# Altium footprint library Connectors.PcbLib: 164 footprints (part 7 of 11)
Each footprint in its own frame and in the unit in brackets; x right, y up, seen from the top. Pads: shape width x height; smd on the part's side, far side on the other; paste and mask are expansions set on the pad; w line width, h text height; cw(c..) or ccw(c..) is an arc to the next point about the centre after c.
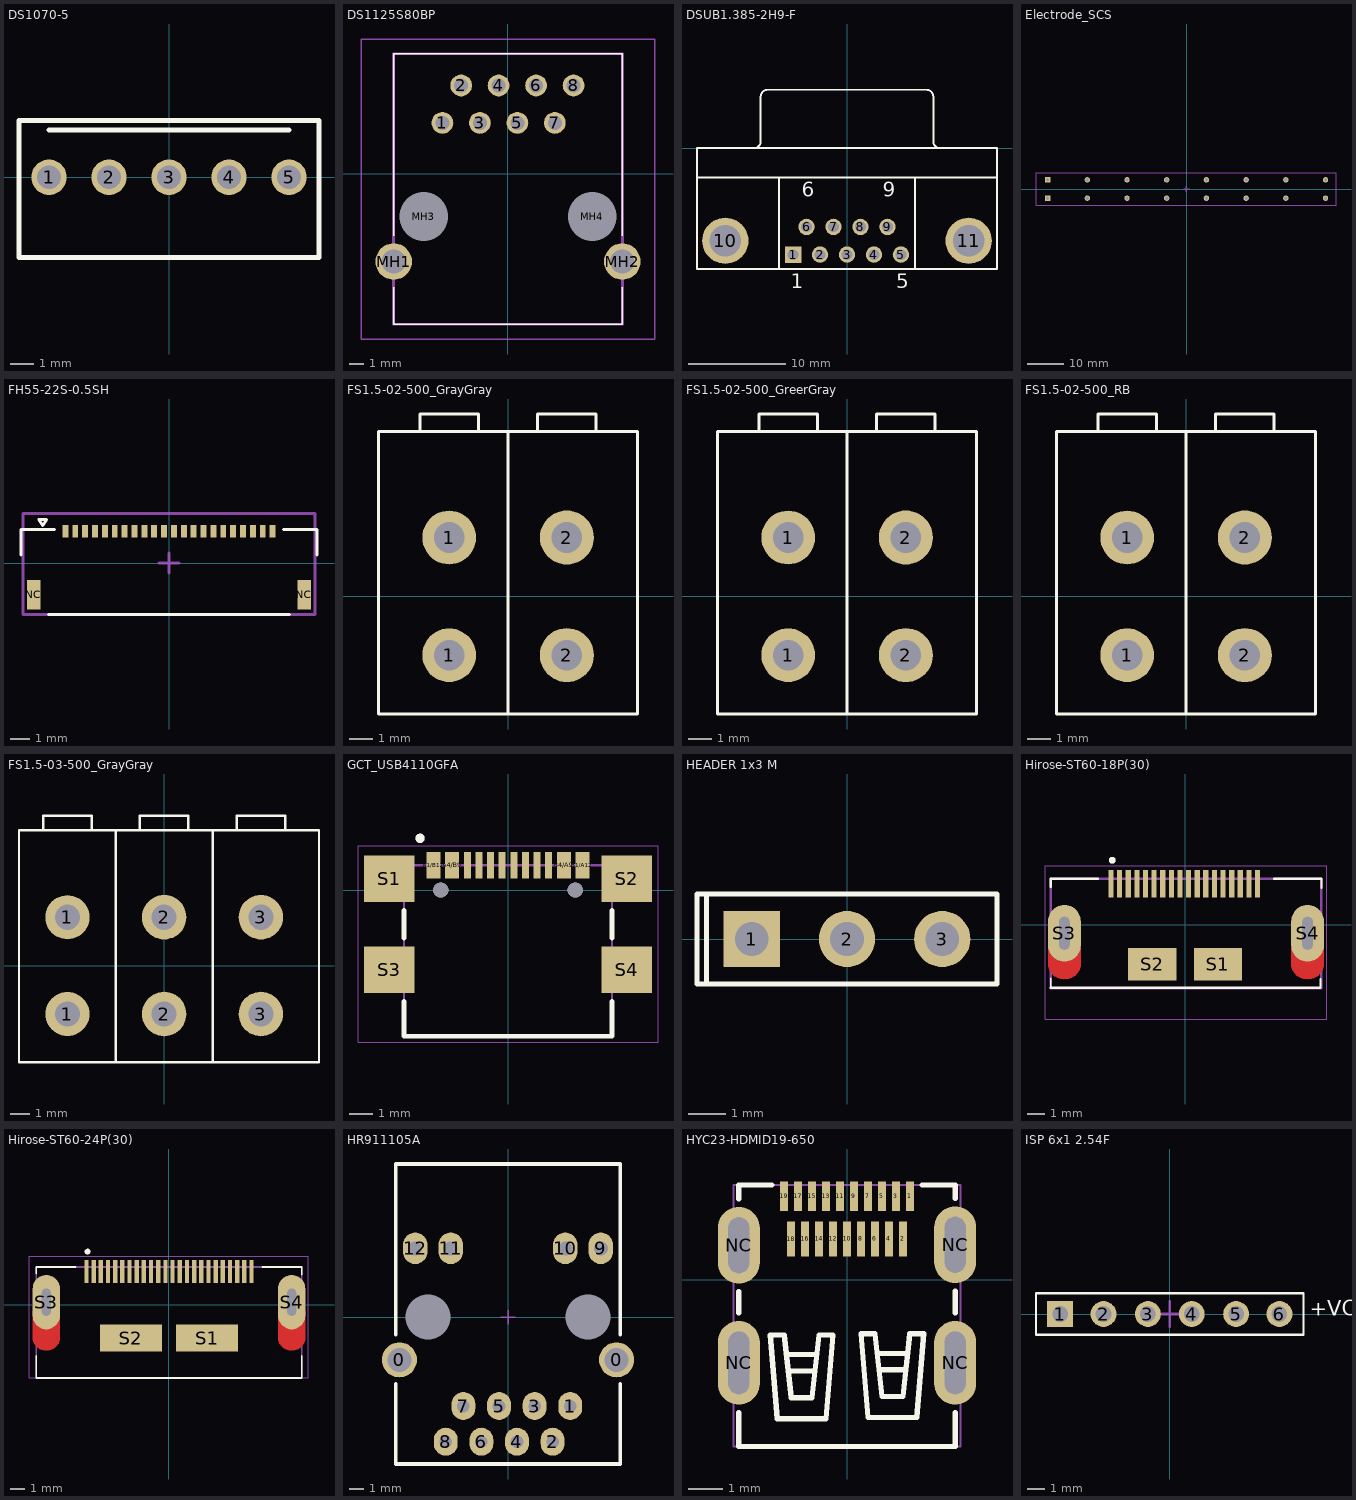
[diagram p6: the footprints below, top view; thin cyan lines are the x and y axes]

## DS1070-5 [mm]
height 11.5
pads (5):
  round 1.5 hole 1: 1(-5.08,0) 2(-2.54,0) 3(0,0) 4(2.54,0) 5(5.08,0)
Top Overlay:
  lines w0.2: -5.08,2 5.08,2 ; -6.35,-3.4 6.35,-3.4 6.35,2.4 -6.35,2.4 -6.35,-3.4
3D body "User Library-DS1070-5 (WF-5 CONNFLY).step": height 11.4, standoff -3.3, extent -6.35,-3.5 6.35,2.4

## DS1125S80BP [mm] "female 8p8c(rj45)"
pads (12):
  round 1.478 hole 0.95: 1(-4.445,3.43) 2(-3.175,5.97) 3(-1.905,3.43) 4(-0.635,5.97) 5(0.635,3.43) 6(1.905,5.97) 7(3.175,3.43) 8(4.445,5.97)
  round 2.475 hole 1.65: MH1(-7.75,-5.97) MH2(7.75,-5.97)
  round 1.65 hole 3.3 unplated: MH3(-5.715,-2.92) MH4(5.715,-2.92)
Top Overlay:
  lines w0.1: -7.75,-7.72 -7.75,-10.22 7.75,-10.22 7.75,-7.72 ; -7.75,-4.22 -7.75,8.12 7.75,8.12 7.75,-4.22
Mechanical 15:
  lines w0.2: -7.75,-10.22 -7.75,8.12 7.75,8.12 7.75,-10.22 -7.75,-10.22
Mechanical 20:
  lines w0.1: -9.95,-11.22 -9.95,9.12 9.95,9.12 9.95,-11.22 -9.95,-11.22
3D body "DS1125-S80BP.stp": height 12.68, standoff -5, extent -8.475,-10.212 8.475,8.128

## DSUB1.385-2H9-F [mm] "Connector; D Subminiature; 9 Position; Right Angle; Pitch 1.385 mm"
height 12.75
pads (11):
  rect 1.69x1.69 hole 1.09: 1(-5.54,-10.92)
  round 1.69 hole 1.09: 2(-2.77,-10.92) 3(0,-10.92) 4(2.77,-10.92) 5(5.54,-10.92) 6(-4.155,-8.08) 7(-1.385,-8.08) 8(1.385,-8.08) 9(4.155,-8.08)
  round 4.76 hole 3.26: 10(-12.495,-9.5) 11(12.495,-9.5)
Top Overlay:
  lines w0.2: -15.4,-3 15.4,-3 ; -9.56,0.005 ccw(c-9.56,0.7) -8.865,0.7 -8.865,5.3 ; -8.86,5.305 cw(c-8.165,5.305) -8.165,6 8.165,6 cw(c8.165,5.305) 8.86,5.305 ; -7,-12.4 -7,-3 ; 7,-12.4 7,-3 ; 8.865,5.3 8.865,0.7 ccw(c9.56,0.7) 9.56,0.005 ; -15.4,-12.4 15.4,-12.4 15.4,0 -15.4,0 -15.4,-12.4
  text "6" at -4.655,-4.975 h1.5
  text "9" at 3.655,-4.975 h1.5
  text "5" at 5.04,-14.375 h1.5
  text "1" at -5.79,-14.375 h1.5
3D body "User Library-DB9-F-Usa.step": height 12.67, standoff -4.2, extent -15.405,-12.5 15.405,5.8

## Electrode_SCS [mm] "connector implanted  electrode reused from Rishena PCB"
pads (16):
  rect 1.5x1.5 hole 0.9: 1(-38.5,-2.54) 1(-38.5,2.54)
  round 1.5 hole 0.9: 2(-27.5,-2.54) 2(-27.5,2.54) 3(-16.5,-2.54) 3(-16.5,2.54) 4(-5.5,-2.54) 4(-5.5,2.54) 5(5.5,-2.54) 5(5.5,2.54) 6(16.5,-2.54) 6(16.5,2.54) 7(27.5,-2.54) 7(27.5,2.54) 8(38.5,-2.54) 8(38.5,2.54)
Mechanical 15:
  lines w0.15: -0.78,0.04 0.72,0.04 ; -0.03,-0.71 -0.03,0.79
  lines w0.254: -41.719,-4.539 41.4,-4.539 41.4,4.54 -41.719,4.54 -41.719,-4.539
3D body "Part Studio 2.step": height 5, standoff 3, extent -41,-2.512 56.036,2.51
3D body "Part Studio 1 (2).step": height 7.25, standoff -1.5, extent -38.65,-2.69 -38.35,2.69
3D body "Part Studio 1 (2).step": height 7.25, standoff -1.5, extent -27.65,-2.69 -27.35,2.69
3D body "Part Studio 1 (2).step": height 7.25, standoff -1.5, extent -16.65,-2.69 -16.35,2.69
3D body "Part Studio 1 (2).step": height 7.25, standoff -1.5, extent -5.65,-2.69 -5.35,2.69
3D body "Part Studio 1 (2).step": height 7.25, standoff -1.5, extent 5.35,-2.69 5.65,2.69
3D body "Part Studio 1 (2).step": height 7.25, standoff -1.5, extent 16.35,-2.69 16.65,2.69
3D body "Part Studio 1 (2).step": height 7.25, standoff -1.5, extent 27.35,-2.69 27.65,2.69
3D body "Part Studio 1 (2).step": height 7.25, standoff -1.5, extent 38.35,-2.69 38.65,2.69

## FH55-22S-0.5SH [mm]
pads (24):
  rect 0.3x0.65 smd mask+0.07: 1(-5.25,1.613) 2(-4.75,1.613) 3(-4.25,1.613) 4(-3.75,1.613) 5(-3.25,1.613) 6(-2.75,1.613) 7(-2.25,1.613) 8(-1.75,1.613) 9(-1.25,1.613) 10(-0.75,1.613) 11(-0.25,1.613) 12(0.25,1.613) 13(0.75,1.613) 14(1.25,1.613) 15(1.75,1.613) 16(2.25,1.613) 17(2.75,1.613) 18(3.25,1.613) 19(3.75,1.613) 20(4.25,1.613) 21(4.75,1.613) 22(5.25,1.613)
  rect 0.7x1.5 smd mask+0.07: NC(-6.85,-1.612) NC(6.85,-1.612)
Top Overlay:
  lines w0.15: -7.5,0.4 -7.5,1.7 -5.8,1.7 ; -6.1,-2.6 6.1,-2.6 ; 5.8,1.7 7.5,1.7 7.5,0.4 ; -6.6,2.2 -6.4,1.9 -6.2,2.2 -6.6,2.2
Mechanical 15:
  lines w0.15: -0.5,0 0.5,0 ; 0,-0.5 0,0.5 ; -7.4,-2.6 -7.4,2.5 7.4,2.5 7.4,-2.6 -7.4,-2.6
3D body "FH55-22S-0.5SH.stp": height 1.49, standoff -0.01, extent -7.2,-2.45 7.2,1.8

## FS1.5-02-500_GrayGray [mm]
height 12.5
pads (4):
  round 2.286 hole 1.3: 1(-2.5,-2.5) 1(-2.5,2.5)
  round 2.3 hole 1.3: 2(2.5,-2.5) 2(2.5,2.5)
Top Overlay:
  lines w0.127: -3.75,7 -3.75,7.75 -1.25,7.75 -1.25,7 ; 0,-5 0,7 ; 1.25,7 1.25,7.75 3.75,7.75 3.75,7 ; -5.5,-5 5.5,-5 5.5,7 -5.5,7 -5.5,-5
3D body: height 12.5, standoff 0, extent -5.499,-4.999 -0.001,6.999
3D body: height 12.5, standoff 0, extent 0.001,-4.999 5.499,6.999
3D body: height 8.5, standoff 6.5, extent -3.749,7.001 -1.251,7.749
3D body: height 8.5, standoff 6.5, extent 1.251,7.001 3.749,7.749

## FS1.5-02-500_GreerGray [mm]
height 12.5
pads (4):
  round 2.286 hole 1.3: 1(-2.5,-2.5) 1(-2.5,2.5)
  round 2.3 hole 1.3: 2(2.5,-2.5) 2(2.5,2.5)
Top Overlay:
  lines w0.127: -3.75,7 -3.75,7.75 -1.25,7.75 -1.25,7 ; 0,-5 0,7 ; 1.25,7 1.25,7.75 3.75,7.75 3.75,7 ; -5.5,-5 5.5,-5 5.5,7 -5.5,7 -5.5,-5
3D body: height 12.5, standoff 0, extent -5.499,-4.999 -0.001,6.999
3D body: height 12.5, standoff 0, extent 0.001,-4.999 5.499,6.999
3D body: height 8.5, standoff 6.5, extent -3.749,7.001 -1.251,7.749
3D body: height 8.5, standoff 6.5, extent 1.251,7.001 3.749,7.749

## FS1.5-02-500_RB [mm]
height 12.5
pads (4):
  round 2.286 hole 1.3: 1(-2.5,-2.5) 1(-2.5,2.5)
  round 2.3 hole 1.3: 2(2.5,-2.5) 2(2.5,2.5)
Top Overlay:
  lines w0.127: -3.75,7 -3.75,7.75 -1.25,7.75 -1.25,7 ; 0,-5 0,7 ; 1.25,7 1.25,7.75 3.75,7.75 3.75,7 ; -5.5,-5 5.5,-5 5.5,7 -5.5,7 -5.5,-5
3D body: height 12.5, standoff 0, extent -5.499,-4.999 -0.001,6.999
3D body: height 12.5, standoff 0, extent 0.001,-4.999 5.499,6.999
3D body: height 8.5, standoff 6.5, extent -3.749,7.001 -1.251,7.749
3D body: height 8.5, standoff 6.5, extent 1.251,7.001 3.749,7.749

## FS1.5-03-500_GrayGray [mm]
height 12.5
pads (6):
  round 2.286 hole 1.3: 1(-5,-2.5) 1(-5,2.5)
  round 2.3 hole 1.3: 2(0,-2.5) 2(0,2.5) 3(5,-2.5) 3(5,2.5)
Top Overlay:
  lines w0.127: -6.25,7 -6.25,7.75 -3.75,7.75 -3.75,7 ; -2.5,-5 -2.5,7 ; -1.25,7 -1.25,7.75 1.25,7.75 1.25,7 ; 3.75,7 3.75,7.75 6.25,7.75 6.25,7 ; 2.5,-5 8,-5 8,7 2.5,7 ; 2.5,-5 -7.5,-5 -7.5,7 2.5,7 ; 2.5,-5 2.5,7
3D body: height 8.5, standoff 6.5, extent -1.249,7.001 1.249,7.749
3D body: height 8.5, standoff 6.5, extent -6.249,7.001 -3.751,7.749
3D body: height 12.5, standoff 0, extent -2.499,-4.999 2.5,6.999
3D body: height 12.5, standoff 0, extent -7.5,-4.999 -2.501,6.999
3D body: height 12.5, standoff 0, extent 2.501,-4.999 8,6.999
3D body: height 8.5, standoff 6.5, extent 3.751,7.001 6.249,7.749

## GCT_USB4110GFA [mm]
pads (18):
  rect 0.6x1.15 smd: A1/B12(-3.2,1.075) A4/B9(-2.4,1.075) B1/A12(3.2,1.075) B4/A9(2.4,1.075)
  rect 0.3x1.15 smd: A5(-1.25,1.075) A6(-0.25,1.075) A7(0.25,1.075) A8(1.25,1.075) B5(1.75,1.075) B6(0.75,1.075) B7(-0.75,1.075) B8(-1.75,1.075)
  rect 2.18x2 smd: S1(-5.11,0.5) S2(5.11,0.5) S3(-5.11,-3.43) S4(5.11,-3.43)
  round 0.65 hole 0.65 unplated: ""(-2.89,0) ""(2.89,0)
Top Overlay:
  circle w0.2: c-3.78,2.23 r0.1
  lines w0.2: -4.47,-4.79 -4.47,-6.28 4.47,-6.28 4.47,-4.79 ; -4.47,-2.07 -4.47,-0.86 ; 4.47,-2.07 4.47,-0.86
Mechanical 13:
  circle w0.2: c-3.78,2.23 r0.1
  lines w0.1: -4.47,-6.28 4.47,-6.28 4.47,1.07 -4.47,1.07 -4.47,-6.28
Mechanical 15:
  lines w0.05: -6.45,-6.53 -6.45,1.9 6.45,1.9 6.45,-6.53 -6.45,-6.53
3D body "step_temp.STEP": height 3.26, standoff -0.63, extent -5.65,-6.28 5.65,1.42

## HEADER 1x3 M [mm]
height 8.5
pads (3):
  rect 1.5x1.5 hole 0.9: 1(-2.54,0)
  round 1.5 hole 0.9: 2(0,0) 3(2.54,0)
Top Overlay:
  lines w0.127: -3.75,-1.2 -3.75,1.2 ; -4,-1.2 4,-1.2 4,1.2 -4,1.2 -4,-1.2
3D body "User Library-1x3 TH Pitch 2_54mm.STEP": height 9.2, standoff -3.5, extent -3.81,-1.27 3.81,1.27

## Hirose-ST60-18P(30) [mm] "SMD,P=0.5mm,Surface Mount,Right Angle Wire To Board Connector ROHS"
pads (22):
  rect 0.3x1.6 smd: 1(-4.3,2.363) 2(-3.8,2.363) 3(-3.3,2.363) 4(-2.8,2.363) 5(-2.3,2.363) 6(-1.8,2.363) 7(-1.3,2.363) 8(-0.8,2.363) 9(-0.3,2.363) 10(0.2,2.363) 11(0.7,2.363) 12(1.2,2.363) 13(1.7,2.363) 14(2.2,2.363) 15(2.7,2.363) 16(3.2,2.363) 17(3.7,2.363) 18(4.2,2.363)
  rect 2.8x1.9 smd: S1(1.9,-2.3) S2(-1.9,-2.3)
  oval 1.9x3.3 / inner oval 1.9x3.8 / far side oval 1.9x3.3 hole 0.6 slot 1.9 at 90 deg: S3(-7,-0.5) S4(7.1,-0.5)
Top Layer:
  region: 8.05,-2.3 8.046,-2.344 8.04,-2.391 8.032,-2.437 8.021,-2.483 8.007,-2.529 7.992,-2.573 7.973,-2.617 7.953,-2.659 7.931,-2.701 7.906,-2.741 7.879,-2.78 7.851,-2.817 7.82,-2.853 7.787,-2.887 7.753,-2.92 7.717,-2.951 7.68,-2.979 7.641,-3.006 7.601,-3.031 7.559,-3.053 7.517,-3.073 7.473,-3.092 7.429,-3.107 7.383,-3.121 7.337,-3.132 7.291,-3.14 7.244,-3.146 7.197,-3.15 7.15,-3.151 7.1,-3.15 7.05,-3.151 7.003,-3.15 6.956,-3.146 6.909,-3.14 6.863,-3.132 6.817,-3.121 6.771,-3.107 6.727,-3.092 6.683,-3.073 6.641,-3.053 6.599,-3.031 6.559,-3.006 6.52,-2.979 6.483,-2.951 6.447,-2.92 6.413,-2.887 6.38,-2.853 6.349,-2.817 6.321,-2.78 6.294,-2.741 6.269,-2.701 6.247,-2.659 6.227,-2.617 6.208,-2.573 6.193,-2.529 6.179,-2.483 6.168,-2.437 6.16,-2.391 6.154,-2.344 6.15,-2.3 6.15,-0.45 6.8,-0.45 6.8,-1.5 7.4,-1.5 7.4,-0.45 8.05,-0.45
  region: -6.05,-2.3 -6.054,-2.344 -6.06,-2.391 -6.068,-2.437 -6.079,-2.483 -6.093,-2.529 -6.108,-2.573 -6.127,-2.617 -6.147,-2.659 -6.169,-2.701 -6.194,-2.741 -6.221,-2.78 -6.249,-2.817 -6.28,-2.853 -6.313,-2.887 -6.347,-2.92 -6.383,-2.951 -6.42,-2.979 -6.459,-3.006 -6.499,-3.031 -6.541,-3.053 -6.583,-3.073 -6.627,-3.092 -6.671,-3.107 -6.717,-3.121 -6.763,-3.132 -6.809,-3.14 -6.856,-3.146 -6.903,-3.15 -6.95,-3.151 -7,-3.15 -7.05,-3.151 -7.097,-3.15 -7.144,-3.146 -7.191,-3.14 -7.237,-3.132 -7.283,-3.121 -7.329,-3.107 -7.373,-3.092 -7.417,-3.073 -7.459,-3.053 -7.501,-3.031 -7.541,-3.006 -7.58,-2.979 -7.617,-2.951 -7.653,-2.92 -7.687,-2.887 -7.72,-2.853 -7.751,-2.817 -7.779,-2.78 -7.806,-2.741 -7.831,-2.701 -7.853,-2.659 -7.873,-2.617 -7.892,-2.573 -7.907,-2.529 -7.921,-2.483 -7.932,-2.437 -7.94,-2.391 -7.946,-2.344 -7.95,-2.3 -7.95,-0.45 -7.3,-0.45 -7.3,-1.5 -6.7,-1.5 -6.7,-0.45 -6.05,-0.45
Top Overlay:
  circle w0.2: c-4.225,3.738 r0.1
  lines w0.1: -7.8,-3.662 -7.8,-3.1 ; 7.85,-3.662 7.85,-3.15
  lines w0.127: -7.8,-3.662 7.85,-3.662 ; -7.8,2.187 -7.8,2.663 -5.05,2.663 ; 5.15,2.663 7.9,2.663 7.9,2.138
Top Paste:
  region: 8.05,-2.2 8.046,-2.244 8.04,-2.291 8.032,-2.337 8.021,-2.383 8.007,-2.429 7.992,-2.473 7.973,-2.517 7.953,-2.559 7.931,-2.601 7.906,-2.641 7.879,-2.68 7.851,-2.717 7.82,-2.753 7.787,-2.787 7.753,-2.82 7.717,-2.851 7.68,-2.879 7.641,-2.906 7.601,-2.931 7.559,-2.953 7.517,-2.973 7.473,-2.992 7.429,-3.007 7.383,-3.021 7.337,-3.032 7.291,-3.04 7.244,-3.046 7.197,-3.05 7.15,-3.051 7.1,-3.05 7.05,-3.051 7.003,-3.05 6.956,-3.046 6.909,-3.04 6.863,-3.032 6.817,-3.021 6.771,-3.007 6.727,-2.992 6.683,-2.973 6.641,-2.953 6.599,-2.931 6.559,-2.906 6.52,-2.879 6.483,-2.851 6.447,-2.82 6.413,-2.787 6.38,-2.753 6.349,-2.717 6.321,-2.68 6.294,-2.641 6.269,-2.601 6.247,-2.559 6.227,-2.517 6.208,-2.473 6.193,-2.429 6.179,-2.383 6.168,-2.337 6.16,-2.291 6.154,-2.244 6.15,-2.2 6.15,0.4 6.8,0.4 6.8,-1.4 7.4,-1.4 7.4,0.5 8.05,0.5
  region: -6.05,-2.2 -6.054,-2.244 -6.06,-2.291 -6.068,-2.337 -6.079,-2.383 -6.093,-2.429 -6.108,-2.473 -6.127,-2.517 -6.147,-2.559 -6.169,-2.601 -6.194,-2.641 -6.221,-2.68 -6.249,-2.717 -6.28,-2.753 -6.313,-2.787 -6.347,-2.82 -6.383,-2.851 -6.42,-2.879 -6.459,-2.906 -6.499,-2.931 -6.541,-2.953 -6.583,-2.973 -6.627,-2.992 -6.671,-3.007 -6.717,-3.021 -6.763,-3.032 -6.809,-3.04 -6.856,-3.046 -6.903,-3.05 -6.95,-3.051 -7,-3.05 -7.05,-3.051 -7.097,-3.05 -7.144,-3.046 -7.191,-3.04 -7.237,-3.032 -7.283,-3.021 -7.329,-3.007 -7.373,-2.992 -7.417,-2.973 -7.459,-2.953 -7.501,-2.931 -7.541,-2.906 -7.58,-2.879 -7.617,-2.851 -7.653,-2.82 -7.687,-2.787 -7.72,-2.753 -7.751,-2.717 -7.779,-2.68 -7.806,-2.641 -7.831,-2.601 -7.853,-2.559 -7.873,-2.517 -7.892,-2.473 -7.907,-2.429 -7.921,-2.383 -7.932,-2.337 -7.94,-2.291 -7.946,-2.244 -7.95,-2.2 -7.95,0.4 -7.3,0.4 -7.3,-1.4 -6.7,-1.4 -6.7,0.5 -6.05,0.5
Top Solder:
  region: 8.162,-2.19 8.161,-2.245 8.156,-2.3 8.149,-2.355 8.139,-2.409 8.126,-2.462 8.111,-2.515 8.092,-2.567 8.071,-2.617 8.048,-2.667 8.021,-2.715 7.993,-2.762 7.961,-2.807 7.928,-2.851 7.892,-2.893 7.854,-2.933 7.815,-2.971 7.773,-3.006 7.729,-3.04 7.684,-3.071 7.637,-3.1 7.589,-3.126 7.539,-3.149 7.488,-3.171 7.436,-3.189 7.384,-3.204 7.33,-3.217 7.276,-3.227 7.222,-3.235 7.167,-3.239 7.112,-3.24 7.062,-3.24 7.01,-3.239 6.957,-3.235 6.906,-3.228 6.854,-3.218 6.803,-3.206 6.753,-3.191 6.704,-3.174 6.655,-3.154 6.608,-3.131 6.562,-3.106 6.517,-3.079 6.474,-3.049 6.433,-3.017 6.393,-2.983 6.355,-2.947 6.319,-2.909 6.285,-2.87 6.253,-2.828 6.223,-2.785 6.196,-2.74 6.171,-2.694 6.148,-2.647 6.128,-2.599 6.111,-2.549 6.096,-2.499 6.084,-2.448 6.074,-2.397 6.067,-2.345 6.063,-2.293 6.062,-2.24 6.062,-1.3 8.162,-1.3
  region: -5.938,-2.19 -5.939,-2.245 -5.944,-2.3 -5.951,-2.355 -5.961,-2.409 -5.974,-2.462 -5.989,-2.515 -6.008,-2.567 -6.029,-2.617 -6.052,-2.667 -6.079,-2.715 -6.107,-2.762 -6.139,-2.807 -6.172,-2.851 -6.208,-2.893 -6.246,-2.933 -6.285,-2.971 -6.327,-3.006 -6.371,-3.04 -6.416,-3.071 -6.463,-3.1 -6.511,-3.126 -6.561,-3.149 -6.612,-3.171 -6.664,-3.189 -6.716,-3.204 -6.77,-3.217 -6.824,-3.227 -6.878,-3.235 -6.933,-3.239 -6.988,-3.24 -7.038,-3.24 -7.09,-3.239 -7.143,-3.235 -7.194,-3.228 -7.246,-3.218 -7.297,-3.206 -7.347,-3.191 -7.396,-3.174 -7.445,-3.154 -7.492,-3.131 -7.538,-3.106 -7.583,-3.079 -7.626,-3.049 -7.667,-3.017 -7.707,-2.983 -7.745,-2.947 -7.781,-2.909 -7.815,-2.87 -7.847,-2.828 -7.877,-2.785 -7.904,-2.74 -7.929,-2.694 -7.952,-2.647 -7.972,-2.599 -7.989,-2.549 -8.004,-2.499 -8.016,-2.448 -8.026,-2.397 -8.033,-2.345 -8.037,-2.293 -8.038,-2.24 -8.038,-1.3 -5.938,-1.3
Mechanical 13:
  circle w0.2: c-4.225,3.738 r0.1
  lines w0.127: -7.8,-3.7 7.9,-3.7 7.9,2.663 3.938,2.663 -3.887,2.663 -7.8,2.663 -7.8,-3.7
Mechanical 15:
  lines w0.05: -8.1,-5.5 -8.1,3.413 8.2,3.413 8.2,-5.5 -8.1,-5.5
3D body "ST60-18P.stp": height 3.62, standoff -0.68, extent -7.784,-5.496 7.725,2.584

## Hirose-ST60-24P(30) [mm] "SMD,P=0.5mm,Surface Mount,Right Angle Wire To Board Connector ROHS"
pads (28):
  rect 0.3x1.6 smd: 1(-5.75,2.325) 2(-5.25,2.325) 3(-4.75,2.325) 4(-4.25,2.325) 5(-3.75,2.325) 6(-3.25,2.325) 7(-2.75,2.325) 8(-2.25,2.325) 9(-1.75,2.325) 10(-1.25,2.325) 11(-0.75,2.325) 12(-0.25,2.325) 13(0.25,2.325) 14(0.75,2.325) 15(1.25,2.325) 16(1.75,2.325) 17(2.25,2.325) 18(2.75,2.325) 19(3.25,2.325) 20(3.75,2.325) 21(4.25,2.325) 22(4.75,2.325) 23(5.25,2.325) 24(5.75,2.325)
  rect 4.3x1.9 smd: S1(2.65,-2.325) S2(-2.65,-2.325)
  oval 1.9x3.8 hole 0.6 slot 1.9 at 90 deg: S3(-8.55,0.175) S4(8.55,0.175)
Top Layer:
  region: 9.5,-2.325 9.496,-2.369 9.49,-2.416 9.482,-2.462 9.471,-2.508 9.457,-2.554 9.442,-2.598 9.423,-2.642 9.403,-2.684 9.381,-2.726 9.356,-2.766 9.329,-2.805 9.301,-2.842 9.27,-2.878 9.237,-2.912 9.203,-2.945 9.167,-2.976 9.13,-3.004 9.091,-3.031 9.051,-3.056 9.009,-3.078 8.967,-3.098 8.923,-3.117 8.879,-3.132 8.833,-3.146 8.787,-3.157 8.741,-3.165 8.694,-3.171 8.647,-3.175 8.6,-3.176 8.55,-3.175 8.5,-3.176 8.453,-3.175 8.406,-3.171 8.359,-3.165 8.313,-3.157 8.267,-3.146 8.221,-3.132 8.177,-3.117 8.133,-3.098 8.091,-3.078 8.049,-3.056 8.009,-3.031 7.97,-3.004 7.933,-2.976 7.897,-2.945 7.863,-2.912 7.83,-2.878 7.799,-2.842 7.771,-2.805 7.744,-2.766 7.719,-2.726 7.697,-2.684 7.677,-2.642 7.658,-2.598 7.643,-2.554 7.629,-2.508 7.618,-2.462 7.61,-2.416 7.604,-2.369 7.6,-2.325 7.6,-0.475 8.25,-0.475 8.25,-1.525 8.85,-1.525 8.85,-0.475 9.5,-0.475
  region: -7.6,-2.325 -7.604,-2.369 -7.61,-2.416 -7.618,-2.462 -7.629,-2.508 -7.643,-2.554 -7.658,-2.598 -7.677,-2.642 -7.697,-2.684 -7.719,-2.726 -7.744,-2.766 -7.771,-2.805 -7.799,-2.842 -7.83,-2.878 -7.863,-2.912 -7.897,-2.945 -7.933,-2.976 -7.97,-3.004 -8.009,-3.031 -8.049,-3.056 -8.091,-3.078 -8.133,-3.098 -8.177,-3.117 -8.221,-3.132 -8.267,-3.146 -8.313,-3.157 -8.359,-3.165 -8.406,-3.171 -8.453,-3.175 -8.5,-3.176 -8.55,-3.175 -8.6,-3.176 -8.647,-3.175 -8.694,-3.171 -8.741,-3.165 -8.787,-3.157 -8.833,-3.146 -8.879,-3.132 -8.923,-3.117 -8.967,-3.098 -9.009,-3.078 -9.051,-3.056 -9.091,-3.031 -9.13,-3.004 -9.167,-2.976 -9.203,-2.945 -9.237,-2.912 -9.27,-2.878 -9.301,-2.842 -9.329,-2.805 -9.356,-2.766 -9.381,-2.726 -9.403,-2.684 -9.423,-2.642 -9.442,-2.598 -9.457,-2.554 -9.471,-2.508 -9.482,-2.462 -9.49,-2.416 -9.496,-2.369 -9.5,-2.325 -9.5,-0.475 -8.85,-0.475 -8.85,-1.525 -8.25,-1.525 -8.25,-0.475 -7.6,-0.475
Top Overlay:
  circle w0.2: c-5.675,3.7 r0.1
  lines w0.127: -9.25,-3.575 -9.25,-5.1 9.25,-5.1 9.25,-3.575 ; -9.25,2.15 -9.25,2.625 -6.5,2.625 ; 6.5,2.625 9.25,2.625 9.25,2.1
Top Solder:
  region: 9.6,-2.225 9.599,-2.28 9.594,-2.335 9.587,-2.389 9.577,-2.443 9.564,-2.497 9.549,-2.549 9.53,-2.601 9.509,-2.652 9.486,-2.702 9.459,-2.75 9.431,-2.797 9.399,-2.842 9.366,-2.886 9.33,-2.928 9.292,-2.967 9.253,-3.005 9.211,-3.041 9.167,-3.074 9.122,-3.106 9.075,-3.134 9.027,-3.161 8.977,-3.184 8.926,-3.205 8.874,-3.224 8.822,-3.239 8.768,-3.252 8.714,-3.262 8.66,-3.269 8.605,-3.274 8.55,-3.275 8.5,-3.275 8.448,-3.274 8.395,-3.27 8.344,-3.263 8.292,-3.253 8.241,-3.241 8.191,-3.226 8.142,-3.209 8.093,-3.189 8.046,-3.166 8,-3.141 7.955,-3.114 7.912,-3.084 7.871,-3.052 7.831,-3.018 7.793,-2.982 7.757,-2.944 7.723,-2.904 7.691,-2.863 7.661,-2.82 7.634,-2.775 7.609,-2.729 7.586,-2.682 7.566,-2.633 7.549,-2.584 7.534,-2.534 7.522,-2.483 7.512,-2.431 7.505,-2.38 7.501,-2.327 7.5,-2.275 7.5,-0.9 9.6,-0.9
  region: -7.5,-2.225 -7.501,-2.28 -7.506,-2.335 -7.513,-2.389 -7.523,-2.443 -7.536,-2.497 -7.551,-2.549 -7.57,-2.601 -7.591,-2.652 -7.614,-2.702 -7.641,-2.75 -7.669,-2.797 -7.701,-2.842 -7.734,-2.886 -7.77,-2.928 -7.808,-2.967 -7.847,-3.005 -7.889,-3.041 -7.933,-3.074 -7.978,-3.106 -8.025,-3.134 -8.073,-3.161 -8.123,-3.184 -8.174,-3.205 -8.226,-3.224 -8.278,-3.239 -8.332,-3.252 -8.386,-3.262 -8.44,-3.269 -8.495,-3.274 -8.55,-3.275 -8.6,-3.275 -8.652,-3.274 -8.705,-3.27 -8.756,-3.263 -8.808,-3.253 -8.859,-3.241 -8.909,-3.226 -8.958,-3.209 -9.007,-3.189 -9.054,-3.166 -9.1,-3.141 -9.145,-3.114 -9.188,-3.084 -9.229,-3.052 -9.269,-3.018 -9.307,-2.982 -9.343,-2.944 -9.377,-2.904 -9.409,-2.863 -9.439,-2.82 -9.466,-2.775 -9.491,-2.729 -9.514,-2.682 -9.534,-2.633 -9.551,-2.584 -9.566,-2.534 -9.578,-2.483 -9.588,-2.431 -9.595,-2.38 -9.599,-2.327 -9.6,-2.275 -9.6,-0.9 -7.5,-0.9
Mechanical 13:
  circle w0.2: c-5.675,3.7 r0.1
  lines w0.127: -9.25,-5.1 9.25,-5.1 9.25,2.625 -9.25,2.625 -9.25,-5.1
Mechanical 15:
  lines w0.05: -9.75,-5.1 -9.75,3.375 9.7,3.375 9.7,-5.1 -9.75,-5.1
3D body "ST60-24P(30).stp": height 3.62, standoff -0.68, extent -9.255,-5.026 9.255,3.054

## HR911105A [mm] "RJ45 Connector with Magnetics Module and LED"
height 13.5
pads (16):
  round 2.5 hole 1.7: 0(-7.745,-3.05) 0(7.745,-3.05)
  round 0 hole 3.2 unplated: 0(-5.715,0) 0(5.715,0)
  oval 1.7x2 hole 0.9: 1(4.44,-6.35) 2(3.18,-8.89) 3(1.9,-6.35) 4(0.64,-8.89) 5(-0.64,-6.35) 6(-1.9,-8.89) 7(-3.18,-6.35) 8(-4.44,-8.89)
  oval 1.75x2.25 hole 1: 9(6.625,4.9) 10(4.085,4.9) 11(-4.085,4.9) 12(-6.625,4.9)
Top Overlay:
  lines w0.25: -8,-4.75 -8,-10.48 8,-10.48 8,-4.75 ; -8,-1.25 -8,10.92 8,10.92 8,-1.25
Mechanical 15:
  lines w0.1: -0.5,0 0.5,0 ; 0,-0.5 0,0.5
3D body "User Library-HR911105A.step": height 13.6, standoff -2.9, extent -7.915,-10.475 7.965,10.925

## HYC23-HDMID19-650 [mm] "microHDMI"
pads (23):
  rect 0.23x0.85 smd paste-100 mask+0.051: 1(1.8,2.387) 3(1.4,2.387) 5(1,2.387) 7(0.6,2.387) 9(0.2,2.387) 11(-0.2,2.387) 13(-0.6,2.387) 15(-1,2.387) 17(-1.4,2.387) 19(-1.8,2.387)
  rect 0.23x1 smd paste-100 mask+0.051: 2(1.6,1.163) 4(1.2,1.163) 6(0.8,1.163) 8(0.4,1.163) 10(0,1.163) 12(-0.4,1.163) 14(-0.8,1.163) 16(-1.2,1.163) 18(-1.6,1.162)
  oval 1.2x2.4 hole 0.6 slot 1.8 at 90 deg: NC(-3.1,-2.387) NC(3.1,-2.387)
  oval 1.2x2.2 hole 0.6 slot 1.6 at 90 deg: NC(-3.1,0.983) NC(3.1,1)
Top Overlay:
  lines w0.15: -3.1,-3.819 -3.1,-4.787 3.1,-4.787 3.1,-3.819 ; -3.1,-0.956 -3.1,-0.349 ; -3.1,2.314 -3.1,2.713 -2.146,2.713 ; -1.738,-2.148 -0.863,-2.15 ; -1.685,-2.621 -0.915,-2.62 ; 0.864,-2.115 1.739,-2.117 ; 0.916,-2.588 1.687,-2.587 ; 2.146,2.713 3.1,2.713 3.1,2.331 ; 3.1,-0.956 3.1,-0.332 ; -2.2,-1.587 -1.8,-1.587 -1.6,-3.387 -1.4,-3.387 -1,-3.387 -0.8,-1.587 -0.4,-1.587 -0.6,-3.987 -0.8,-3.987 -2,-3.987 -2.2,-1.587 ; 0.402,-1.554 0.802,-1.554 1.002,-3.354 1.202,-3.354 1.602,-3.354 1.802,-1.554 2.202,-1.554 2.002,-3.954 1.802,-3.954 0.602,-3.954 0.402,-1.554
Top Paste:
  drawing of 23 lines, arcs and shapes, not listed
Mechanical 15:
  region: 1.72,2.685 1.881,2.685 1.881,2.09 1.72,2.09
  region: 1.519,1.513 1.68,1.513 1.68,0.813 1.519,0.813
  region: 1.32,2.685 1.481,2.685 1.481,2.09 1.32,2.09
  region: 1.119,1.513 1.28,1.513 1.28,0.813 1.119,0.813
  region: 0.919,2.685 1.081,2.685 1.081,2.09 0.919,2.09
  region: 0.72,1.513 0.881,1.513 0.881,0.813 0.72,0.813
  region: 0.519,2.685 0.68,2.685 0.68,2.09 0.519,2.09
  region: 0.32,1.513 0.481,1.513 0.481,0.813 0.32,0.813
  region: 0.119,2.685 0.28,2.685 0.28,2.09 0.119,2.09
  region: -0.081,1.513 0.081,1.513 0.081,0.813 -0.081,0.813
  region: -0.28,2.685 -0.119,2.685 -0.119,2.09 -0.28,2.09
  region: -0.481,1.513 -0.32,1.513 -0.32,0.813 -0.481,0.813
  region: -0.68,2.685 -0.519,2.685 -0.519,2.09 -0.68,2.09
  region: -0.881,1.513 -0.72,1.513 -0.72,0.813 -0.881,0.813
  region: -1.081,2.685 -0.919,2.685 -0.919,2.09 -1.081,2.09
  region: -1.28,1.513 -1.119,1.513 -1.119,0.813 -1.28,0.813
  region: -1.481,2.685 -1.32,2.685 -1.32,2.09 -1.481,2.09
  region: -1.68,1.513 -1.519,1.513 -1.519,0.813 -1.68,0.813
  region: -1.881,2.685 -1.72,2.685 -1.72,2.09 -1.881,2.09
  region: 2.86,-2.987 2.86,-1.787 3.34,-1.787 3.34,-2.987
  region: -3.34,-2.987 -3.34,-1.787 -2.86,-1.787 -2.86,-2.987
  region: -3.34,0.483 -3.34,1.483 -2.86,1.483 -2.86,0.483
  region: 2.86,0.5 2.86,1.5 3.34,1.5 3.34,0.5
  lines w0.051: -3.25,-4.788 3.25,-4.788 3.25,2.713 -3.25,2.713 -3.25,-4.788
3D body "10118242-001RLF.STP": height 3.03, standoff -0.5, extent -3.25,-4.8 3.25,2.7

## ISP 6x1 2.54F [mm]
height 8.5
pads (6):
  rect 1.5x1.5 hole 0.9: 1(-6.35,0)
  round 1.5 hole 0.9: 2(-3.84,0) 3(-1.27,0) 4(1.27,0) 5(3.84,0) 6(6.35,0)
Top Overlay:
  lines w0.127: -7.75,-1.2 7.75,-1.2 7.75,1.2 -7.75,1.2 -7.75,-1.2
  text "+VCC" at 8.1,-0.4 h1.52
Mechanical 15:
  lines w0.15: -0.75,0 0.75,0 ; 0,-0.75 0,0.75
3D body "User Library-Header_Fem_1X6.step": height 8.6, standoff -3.1, extent -7.853,-1.27 7.887,1.27